# Altium footprint library mastermind.PCBLIB: 1061 footprints (part 52 of 67)
Each footprint in its own frame and in the unit in brackets; x right, y up, seen from the top. Pads: shape width x height; smd on the part's side, far side on the other; paste and mask are expansions set on the pad; w line width, h text height; cw(c..) or ccw(c..) is an arc to the next point about the centre after c.
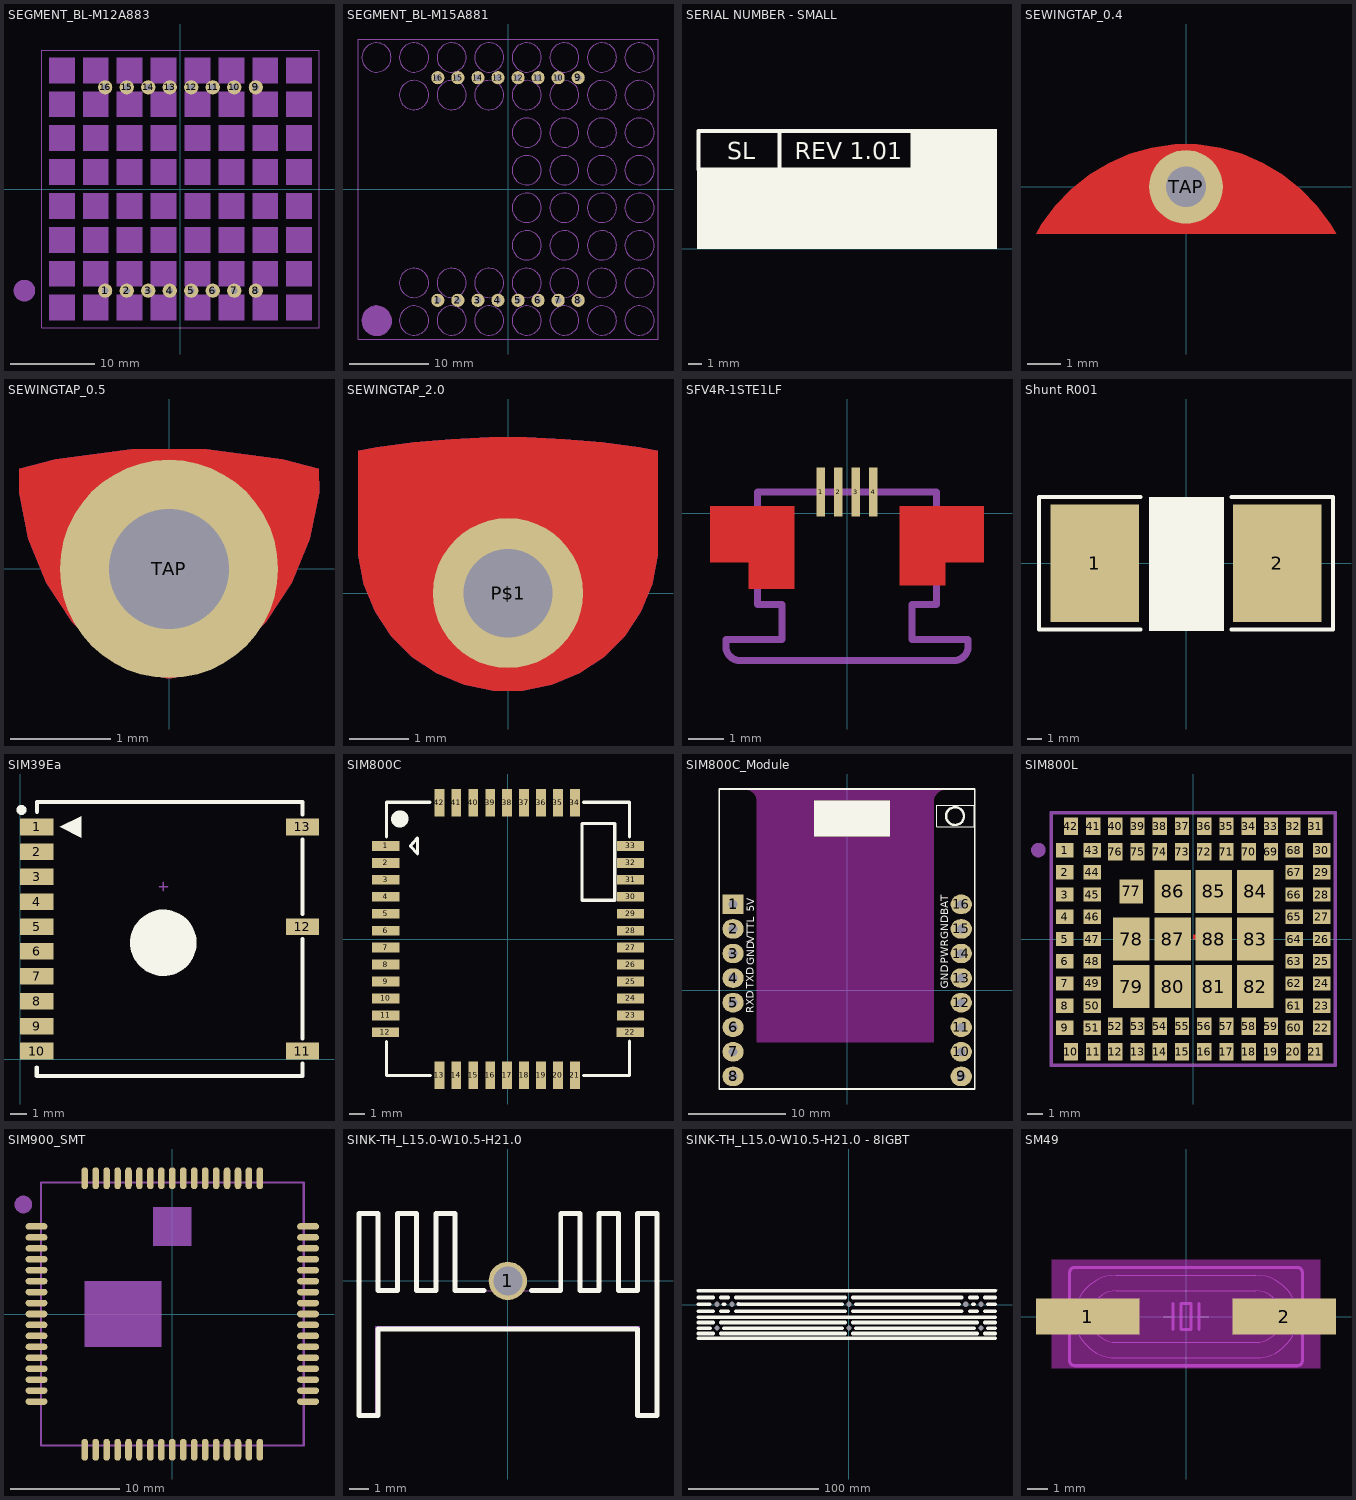
[diagram p51: the footprints below, top view; thin cyan lines are the x and y axes]

## SEGMENT_BL-M12A883 [mil]
pads (16):
  round 66 hole 31.5: 1(-350,-472.44) 2(-250,-472.44) 3(-150,-472.44) 4(-50,-472.44) 5(50,-472.44) 6(150,-472.44) 7(250,-472.44) 8(350,-472.44) 9(350,472.44) 10(250,472.44) 11(150,472.44) 12(50,472.44) 13(-50,472.44) 14(-150,472.44) 15(-250,472.44) 16(-350,472.44)
Mechanical 2:
  circle w50: c-725.59,-472.44 r25
  lines w5: -643.7,-643.7 -643.7,643.7 643.7,643.7 643.7,-643.7 -643.7,-643.7
Mechanical 8:
  drawing of 68 lines, arcs and shapes, not listed

## SEGMENT_BL-M15A881 [mil]
pads (16):
  round 66 hole 31.5: 1(-350,-555.12) 2(-250,-555.12) 3(-150,-555.12) 4(-50,-555.12) 5(50,-555.12) 6(150,-555.12) 7(250,-555.12) 8(350,-555.12) 9(350,555.12) 10(250,555.12) 11(150,555.12) 12(50,555.12) 13(-50,555.12) 14(-150,555.12) 15(-250,555.12) 16(-350,555.12)
Mechanical 2:
  circle w100: c-654.33,-658.66 r25
  lines w5: -748.03,-748.03 -748.03,748.03 748.03,748.03 748.03,-748.03 -748.03,-748.03
Mechanical 8:
  circle w5: c655.91,-655.91 r72.83
  circle w5: c655.91,-468.5 r72.83
  circle w5: c655.91,-281.1 r72.83
  circle w5: c655.91,655.91 r72.83
  circle w5: c655.91,468.5 r72.83
  circle w5: c655.91,281.1 r72.83
  circle w5: c655.91,93.7 r72.83
  circle w5: c655.91,-93.7 r72.83
  circle w5: c-655.91,-655.91 r72.83
  circle w5: c-468.5,-655.91 r72.83
  circle w5: c468.5,-655.91 r72.83
  circle w5: c281.1,-655.91 r72.83
  circle w5: c93.7,-655.91 r72.83
  circle w5: c-93.7,-655.91 r72.83
  circle w5: c-281.1,-655.91 r72.83
  circle w5: c-468.5,-468.5 r72.83
  circle w5: c468.5,-468.5 r72.83
  circle w5: c281.1,-468.5 r72.83
  circle w5: c93.7,-468.5 r72.83
  circle w5: c-93.7,-468.5 r72.83
  circle w5: c-281.1,-468.5 r72.83
  circle w5: c468.5,-281.1 r72.83
  circle w5: c281.1,-281.1 r72.83
  circle w5: c93.7,-281.1 r72.83
  circle w5: c468.5,-93.7 r72.83
  circle w5: c281.1,-93.7 r72.83
  circle w5: c93.7,-93.7 r72.83
  circle w5: c468.5,93.7 r72.83
  circle w5: c281.1,93.7 r72.83
  circle w5: c93.7,93.7 r72.83
  circle w5: c468.5,281.1 r72.83
  circle w5: c281.1,281.1 r72.83
  circle w5: c93.7,281.1 r72.83
  circle w5: c-655.91,655.91 r72.83
  circle w5: c-468.5,655.91 r72.83
  circle w5: c468.5,655.91 r72.83
  circle w5: c281.1,655.91 r72.83
  circle w5: c93.7,655.91 r72.83
  circle w5: c-93.7,655.91 r72.83
  circle w5: c-281.1,655.91 r72.83
  circle w5: c-468.5,468.5 r72.83
  circle w5: c468.5,468.5 r72.83
  circle w5: c281.1,468.5 r72.83
  circle w5: c93.7,468.5 r72.83
  circle w5: c-93.7,468.5 r72.83
  circle w5: c-281.1,468.5 r72.83
  lines w5: -748.03,-748.03 -748.03,748.03 748.03,748.03 748.03,-748.03 -748.03,-748.03

## SERIAL NUMBER - SMALL [mm]
Top Overlay:
  rectangle: 19.052,-0.01 25.402,9.007
  rectangle: 2.807,-0.01 19.19,6.117
  lines w0.3: 9.019,5.959 9.019,8.88 ; 2.923,5.959 19.052,5.959 19.052,8.88 2.923,8.88 2.923,5.959
  text "REV 1.01" at 10.162,6.721 h1.3
  text "SL" at 5.082,6.721 h1.3

## SEWINGTAP_0.4 [mil]
pads (1):
  round 86 hole 47.24: TAP(0,0)
Top Layer:
  region: -175,-55 175,-55 168.51,-43.3 152.58,-21.81 133.98,-2.58 113.04,14.06 90.1,27.83 65.56,38.48 39.84,45.84 13.37,49.77 0,50 -13.37,49.77 -39.84,45.84 -65.56,38.48 -90.1,27.83 -113.04,14.06 -133.98,-2.58 -152.58,-21.81 -168.51,-43.3
Top Solder:
  region: -175,-55 175,-55 168.51,-43.3 152.58,-21.81 133.98,-2.58 113.04,14.06 90.1,27.83 65.56,38.48 39.84,45.84 13.37,49.77 0,50 -13.37,49.77 -39.84,45.84 -65.56,38.48 -90.1,27.83 -113.04,14.06 -133.98,-2.58 -152.58,-21.81 -168.51,-43.3

## SEWINGTAP_0.5 [mil]
pads (1):
  round 86 hole 47.24: TAP(0,0)
Top Layer:
  region: 59.06,39.37 44.61,43.24 14.96,47.15 -14.96,47.15 -44.61,43.24 -59.06,39.37 -59.08,30.06 -55.48,11.78 -48.39,-5.45 -38.07,-20.96 -31.5,-27.56 -28.16,-30.52 -20.78,-35.51 -12.8,-39.5 -4.37,-42.42 0,-43.31 4.37,-42.42 12.8,-39.5 20.78,-35.51 28.16,-30.52 31.5,-27.56 38.07,-20.96 48.39,-5.45 55.48,11.78 59.08,30.06
Bottom Layer:
  region: 59.06,39.37 44.61,43.24 14.96,47.15 -14.96,47.15 -44.61,43.24 -59.06,39.37 -59.08,30.06 -55.48,11.78 -48.39,-5.45 -38.07,-20.96 -31.5,-27.56 -28.16,-30.52 -20.78,-35.51 -12.8,-39.5 -4.37,-42.42 0,-43.31 4.37,-42.42 12.8,-39.5 20.78,-35.51 28.16,-30.52 31.5,-27.56 38.07,-20.96 48.39,-5.45 55.48,11.78 59.08,30.06
Top Solder:
  region: 59.06,39.37 44.61,43.24 14.96,47.15 -14.96,47.15 -44.61,43.24 -59.06,39.37 -59.08,30.06 -55.48,11.78 -48.39,-5.45 -38.07,-20.96 -31.5,-27.56 -28.16,-30.52 -20.78,-35.51 -12.8,-39.5 -4.37,-42.42 0,-43.31 4.37,-42.42 12.8,-39.5 20.78,-35.51 28.16,-30.52 31.5,-27.56 38.07,-20.96 48.39,-5.45 55.48,11.78 59.08,30.06
Bottom Solder:
  region: 59.06,39.37 44.61,43.24 14.96,47.15 -14.96,47.15 -44.61,43.24 -59.06,39.37 -59.08,30.06 -55.48,11.78 -48.39,-5.45 -38.07,-20.96 -31.5,-27.56 -28.16,-30.52 -20.78,-35.51 -12.8,-39.5 -4.37,-42.42 0,-43.31 4.37,-42.42 12.8,-39.5 20.78,-35.51 28.16,-30.52 31.5,-27.56 38.07,-20.96 48.39,-5.45 55.48,11.78 59.08,30.06

## SEWINGTAP_2.0 [mm]
pads (1):
  round 2.54 hole 1.5: P$1(0,0)
Top Layer:
  region: 2.54,2.413 2.226,2.468 1.593,2.552 0.957,2.607 0.319,2.635 -0.319,2.635 -0.957,2.607 -1.593,2.552 -2.226,2.468 -2.54,2.413 -2.54,0.889 -2.54,0.639 -2.442,0.148 -2.251,-0.314 -1.973,-0.73 -1.619,-1.084 -1.203,-1.362 -0.741,-1.553 -0.25,-1.651 0,-1.651 0.25,-1.651 0.741,-1.553 1.203,-1.362 1.619,-1.084 1.973,-0.73 2.251,-0.314 2.442,0.148 2.54,0.639 2.54,0.889
Bottom Layer:
  region: 2.54,2.413 2.226,2.468 1.593,2.552 0.957,2.607 0.319,2.635 -0.319,2.635 -0.957,2.607 -1.593,2.552 -2.226,2.468 -2.54,2.413 -2.54,0.889 -2.54,0.639 -2.442,0.148 -2.251,-0.314 -1.973,-0.73 -1.619,-1.084 -1.203,-1.362 -0.741,-1.553 -0.25,-1.651 0,-1.651 0.25,-1.651 0.741,-1.553 1.203,-1.362 1.619,-1.084 1.973,-0.73 2.251,-0.314 2.442,0.148 2.54,0.639 2.54,0.889
Top Solder:
  region: 2.54,2.413 2.226,2.468 1.593,2.552 0.957,2.607 0.319,2.635 -0.319,2.635 -0.957,2.607 -1.593,2.552 -2.226,2.468 -2.54,2.413 -2.54,0.889 -2.54,0.639 -2.442,0.148 -2.251,-0.314 -1.973,-0.73 -1.619,-1.084 -1.203,-1.362 -0.741,-1.553 -0.25,-1.651 0,-1.651 0.25,-1.651 0.741,-1.553 1.203,-1.362 1.619,-1.084 1.973,-0.73 2.251,-0.314 2.442,0.148 2.54,0.639 2.54,0.889
Bottom Solder:
  region: 2.54,2.413 2.226,2.468 1.593,2.552 0.957,2.607 0.319,2.635 -0.319,2.635 -0.957,2.607 -1.593,2.552 -2.226,2.468 -2.54,2.413 -2.54,0.889 -2.54,0.639 -2.442,0.148 -2.251,-0.314 -1.973,-0.73 -1.619,-1.084 -1.203,-1.362 -0.741,-1.553 -0.25,-1.651 0,-1.651 0.25,-1.651 0.741,-1.553 1.203,-1.362 1.619,-1.084 1.973,-0.73 2.251,-0.314 2.442,0.148 2.54,0.639 2.54,0.889

## SFV4R-1STE1LF [mm]
pads (4):
  rect 0.25x1.4 smd mask-0.7: 1(-0.75,0.6) 2(-0.25,0.6) 3(0.25,0.6) 4(0.75,0.6)
Top Layer:
  region: -3.9,-1.4 -3.9,0.2 -1.5,0.2 -1.5,-1.4
  region: -2.8,-2.15 -2.8,-1.3 -1.5,-1.3 -1.5,-2.15
  region: 1.5,-1.4 1.5,0.2 3.9,0.2 3.9,-1.4
  region: 1.5,-2.05 1.5,-1.2 2.8,-1.2 2.8,-2.05
Top Paste:
  region: -4.275,-1.9 -4.275,0.075 -2.1,0.075 -2.1,-1.9
  region: -3.2,-2.75 -3.2,-1.9 -2.1,-1.9 -2.1,-2.75
  region: 2.1,-1.9 2.1,0.075 4.275,0.075 4.275,-1.9
  region: 2.1,-2.75 2.1,-1.9 3.2,-1.9 3.2,-2.75
Top Solder:
  region: -2.8,-2.15 -2.8,-1.3 -1.5,-1.3 -1.5,-2.15
  region: -0.9,-0.1 -0.9,1.3 -0.6,1.3 -0.6,-0.1
  region: -0.4,-0.1 -0.4,1.3 -0.1,1.3 -0.1,-0.1
  region: 0.1,-0.1 0.1,1.3 0.4,1.3 0.4,-0.1
  region: 0.6,-0.1 0.6,1.3 0.9,1.3 0.9,-0.1
  region: -3.9,-1.4 -3.9,0.2 -1.5,0.2 -1.5,-1.4
  region: 1.5,-1.4 1.5,0.2 3.9,0.2 3.9,-1.4
  region: 1.5,-2.1 1.5,-1.4 2.8,-1.4 2.8,-2.1
Mechanical 2:
  lines w0.203: -2.55,-2.6 -1.85,-2.6 -1.85,-3.6 -3.45,-3.6 -3.45,-3.8 ccw(c-3.05,-3.8) -3.05,-4.2 3.05,-4.2 ccw(c3.05,-3.8) 3.45,-3.8 3.45,-3.6 1.85,-3.6 1.85,-2.6 2.55,-2.6 ; -2.55,0.6 -1.25,0.6 ; 1.25,0.6 2.55,0.6
Mechanical 8:
  lines w0.203: -2.55,-2.6 -2.55,0.6 ; -1.25,0.6 1.25,0.6 ; 2.55,-2.6 2.55,0.6
  lines w0.5: -3.5,-1 -2.7,-1 -2.7,-0.15 -3.5,-0.15 ; 3.5,-1 2.7,-1 2.7,-0.15 3.5,-0.15

## Shunt R001 [mm]
pads (2):
  rect 6x8 smd: 1(-6.2,0) 2(6.2,0)
Top Overlay:
  rectangle: -2.5,-4.6 2.6,4.5
  lines w0.25: -3.1,-4.5 -10,-4.5 -10,4.5 -3.1,4.5 ; 3.1,-4.5 10,-4.5 10,4.5 3.1,4.5
Mechanical 30:
  region: -0.5,-1 -0.5,1 0.5,1 0.5,-1

## SIM39Ea [mm] "Lora module"
height 3.2
pads (13):
  rect 2x1 smd: 1(1,14) 2(1,12.5) 3(1,11) 4(1,9.5) 5(1,8) 6(1,6.5) 7(1,5) 8(1,3.5) 9(1,2) 10(1,0.5) 11(17,0.5) 12(17,8) 13(17,14)
Top Overlay:
  circle w2: c8.623,7.023 r1
  circle w0.3: c0.075,15.025 r0.15
  region: 2.395,14 3.665,13.365 3.665,14.635
  lines w0.254: 0.991,-0.487 0.991,-1 17.005,-1 17.005,-0.254 ; 1.016,14.916 1.016,15.5 9.185,15.5 13.196,15.5 17.005,15.5 17.005,14.754 ; 17.005,1.254 17.005,7.246 ; 17.005,8.754 17.005,13.246
  text ".Designator" at 1.054,-1.829 h1
Mechanical 15:
  lines w0.1: 8.371,10.402 8.879,10.402 ; 8.625,10.148 8.625,10.656

## SIM800C [mil]
pads (42):
  rect 70x25 smd: 1(-312.74,237.81) 2(-312.74,194.5) 3(-312.74,151.2) 4(-312.74,107.89) 5(-312.74,64.58) 6(-312.74,21.28) 7(-312.74,-22.03) 8(-312.74,-65.34) 9(-312.74,-108.65) 10(-312.74,-151.95) 11(-312.74,-195.26) 12(-313.24,-238.19) 22(312.74,-238.19) 23(313.24,-195.26) 24(313.24,-151.95) 25(313.24,-108.65) 26(313.24,-65.34) 27(313.24,-22.03) 28(313.24,21.28) 29(313.24,64.58) 30(313.24,107.89) 31(313.24,151.2) 32(313.24,194.5) 33(313.24,237.81)
  rect 25x70 smd: 13(-175.45,-348.43) 14(-132.14,-348.43) 15(-88.83,-348.43) 16(-45.53,-348.43) 17(-2.22,-348.43) 18(41.09,-348.43) 19(84.4,-348.43) 20(127.7,-348.43) 21(171.01,-348.43) 34(171.01,348.43) 35(127.7,348.43) 36(84.4,348.43) 37(41.09,348.43) 38(-2.22,348.43) 39(-45.53,348.43) 40(-88.83,348.43) 41(-132.14,348.43) 42(-175.45,348.43)
Top Overlay:
  circle w40: c-276.5,307 r2
  lines w8: -311,-261.69 -311,-348.5 -197.95,-348.5 ; -311,260.31 -311,349.5 -199.24,349.5 ; 193.76,-348.5 311,-348.5 311,-260.69 ; 193.76,349.5 311,349.5 311,260.31 ; -249.5,238 -231,217.5 -231,258.5 -249.5,238 ; 189,99 189,295 273,295 273,261 273,99 189,99
3D body "SIM800C.STEP": height 89.51, standoff -2.62, extent -309,-345.56 309.11,347.36

## SIM800C_Module [mm]
pads (16):
  rect 2.2x2 hole 0.9: 1(-11.785,8.89)
  oval 2.2x2 hole 0.9: 2(-11.785,6.35) 3(-11.785,3.81) 4(-11.785,1.27) 5(-11.785,-1.27) 6(-11.785,-3.81) 7(-11.785,-6.35) 8(-11.785,-8.89) 9(11.786,-8.89) 10(11.786,-6.35) 11(11.786,-3.81) 12(11.786,-1.27) 13(11.786,1.27) 14(11.786,3.81) 15(11.786,6.35) 16(11.786,8.89)
Top Overlay:
  circle w0.254: c11.155,18.009 r0.922
  region: 4.385,19.609 4.385,15.909 -3.415,15.909 -3.415,19.609
  lines w0.127: 9.262,16.909 13.155,16.909 13.155,19.109 9.262,19.109 9.262,19.009 9.262,16.909
  lines w0.2: -13.215,-10.191 -13.215,20.809 13.185,20.809 13.185,-10.191 -13.215,-10.191
  text "GND" at 10.433,0.167 h0.8
  text "GND" at 10.456,5.307 h0.8
  text "PWR" at 10.433,2.734 h0.8
  text "BAT" at 10.433,7.767 h0.8
  text "5V" at -9.59,8.121 h0.8
  text "VTTL" at -9.59,4.937 h0.8
  text "GND" at -9.617,2.607 h0.8
  text "TXD" at -9.627,0.167 h0.8
  text "RXD" at -9.637,-2.353 h0.8
Bottom Overlay:
  lines w0.2: -10.16,-1.471 -10.42,-1.261 ; -10.16,-1.051 -10.42,-1.261 ; -10.16,1.007 -10.42,1.217 ; -10.16,1.427 -10.42,1.217 ; -10.16,3.594 -10.42,3.804 ; -10.16,4.014 -10.42,3.804 ; -10.16,6.112 -10.42,6.322 ; -10.16,6.532 -10.42,6.322 ; -9.76,-1.261 -10.42,-1.261 ; -9.76,1.217 -10.42,1.217 ; -9.76,3.804 -10.42,3.804 ; -9.76,6.322 -10.42,6.322 ; 9.743,3.811 10.403,3.811 ; 9.743,6.312 10.403,6.312 ; 9.743,8.865 10.403,8.865 ; 10.143,3.601 10.403,3.811 ; 10.143,4.021 10.403,3.811 ; 10.143,6.102 10.403,6.312 ; 10.143,6.522 10.403,6.312 ; 10.143,8.655 10.403,8.865 ; 10.143,9.075 10.403,8.865
Keep-Out Layer:
  region: -9.244,-5.18 8.885,-5.18 8.885,19.531 8.891,19.657 8.941,19.905 9.037,20.138 9.178,20.348 9.262,20.442 9.548,20.728 9.568,20.746 9.613,20.776 9.663,20.797 9.716,20.807 9.743,20.809 -10.514,20.809 -10.397,20.803 -10.168,20.757 -9.952,20.668 -9.758,20.538 -9.671,20.459 -9.463,20.252 -9.414,20.197 -9.333,20.075 -9.276,19.94 -9.248,19.796 -9.244,19.723
  lines w0.2: -11.238,20.809 -10.514,20.809 cw(c-10.514,19.539) -9.244,19.539 ; -9.244,18.678 -9.244,19.539 ; 10.155,20.809 ccw(c10.155,19.539) 8.885,19.539 8.885,-5.28 -9.244,-5.28 -9.244,19.539

## SIM800L [mm]
pads (88):
  rect 1.1x0.9 smd: 1(-8.1,5.6) 2(-8.1,4.2) 3(-8.1,2.8) 4(-8.1,1.4) 5(-8.1,0) 6(-8.1,-1.4) 7(-8.1,-2.8) 8(-8.1,-4.2) 9(-8.1,-5.6) 22(8.1,-5.6) 23(8.1,-4.2) 24(8.1,-2.8) 25(8.1,-1.4) 26(8.1,0) 27(8.1,1.4) 28(8.1,2.8) 29(8.1,4.2) 30(8.1,5.6) 43(-6.36,5.6) 44(-6.36,4.2) 45(-6.36,2.8) 46(-6.36,1.4) 47(-6.36,0) 48(-6.36,-1.4) 49(-6.36,-2.8) 50(-6.36,-4.2) 51(-6.36,-5.6) 60(6.36,-5.6) 61(6.36,-4.2) 62(6.36,-2.8) 63(6.36,-1.4) 64(6.36,0) 65(6.36,1.4) 66(6.36,2.8) 67(6.36,4.2) 68(6.36,5.6)
  rect 0.9x1.1 smd: 10(-7.7,-7.1) 11(-6.3,-7.1) 12(-4.9,-7.1) 13(-3.5,-7.1) 14(-2.1,-7.1) 15(-0.7,-7.1) 16(0.7,-7.1) 17(2.1,-7.1) 18(3.5,-7.1) 19(4.9,-7.1) 20(6.3,-7.1) 21(7.7,-7.1) 31(7.7,7.1) 32(6.3,7.1) 33(4.9,7.1) 34(3.5,7.1) 35(2.1,7.1) 36(0.7,7.1) 37(-0.7,7.1) 38(-2.1,7.1) 39(-3.5,7.1) 40(-4.9,7.1) 41(-6.3,7.1) 42(-7.7,7.1) 52(-4.9,-5.5) 53(-3.5,-5.5) 54(-2.1,-5.5) 55(-0.7,-5.5) 56(0.7,-5.5) 57(2.1,-5.5) 58(3.5,-5.5) 59(4.9,-5.5) 69(4.9,5.5) 70(3.5,5.5) 71(2.1,5.5) 72(0.7,5.5) 73(-0.7,5.5) 74(-2.1,5.5) 75(-3.5,5.5) 76(-4.9,5.5)
  rect 1.5x1.5 smd: 77(-3.9,3)
  rect 2.3x2.7 smd: 78(-3.9,0) 79(-3.9,-3) 80(-1.3,-3) 81(1.3,-3) 82(3.9,-3) 83(3.9,0) 84(3.9,3) 85(1.3,3) 86(-1.3,3) 87(-1.3,0) 88(1.3,0)
Top Layer:
  region: 0,0 0.254,0 0.254,0.254 0,0.254
Mechanical 2:
  circle w0.61: c-9.75,5.6 r0.15
  lines w0.127: -9,-8 9,-8 9,8 -9,8 -9,-8
Mechanical 8:
  lines w0.127: -8.9,-7.9 -8.9,7.9 8.9,7.9 8.9,-7.9 -8.9,-7.9

## SIM900_SMT [mm]
pads (68):
  rrect100% 2x0.6 smd: P$1(-12.4,8) P$2(-12.4,7) P$3(-12.4,6) P$4(-12.4,5) P$5(-12.4,4) P$6(-12.4,3) P$7(-12.4,2) P$8(-12.4,1) P$9(-12.4,0) P$10(-12.4,-1) P$11(-12.4,-2) P$12(-12.4,-3) P$13(-12.4,-4) P$14(-12.4,-5) P$15(-12.4,-6) P$16(-12.4,-7) P$17(-12.4,-8) P$35(12.4,-8) P$36(12.4,-7) P$37(12.4,-6) P$38(12.4,-5) P$39(12.4,-4) P$40(12.4,-3) P$41(12.4,-2) P$42(12.4,-1) P$43(12.4,0) P$44(12.4,1) P$45(12.4,2) P$46(12.4,3) P$47(12.4,4) P$48(12.4,5) P$49(12.4,6) P$50(12.4,7) P$51(12.4,8)
  rrect100% 0.6x2 smd: P$18(-8,-12.4) P$19(-7,-12.4) P$20(-6,-12.4) P$21(-5,-12.4) P$22(-4,-12.4) P$23(-3,-12.4) P$24(-2,-12.4) P$25(-1,-12.4) P$26(0,-12.4) P$27(1,-12.4) P$28(2,-12.4) P$29(3,-12.4) P$30(4,-12.4) P$31(5,-12.4) P$32(6,-12.4) P$33(7,-12.4) P$34(8,-12.4) P$52(8,12.4) P$53(7,12.4) P$54(6,12.4) P$55(5,12.4) P$56(4,12.4) P$57(3,12.4) P$58(2,12.4) P$59(1,12.4) P$60(0,12.4) P$61(-1,12.4) P$62(-2,12.4) P$63(-3,12.4) P$64(-4,12.4) P$65(-5,12.4) P$66(-6,12.4) P$67(-7,12.4) P$68(-8,12.4)
Mechanical 2:
  circle w0.813: c-13.6,10 r0.4
  lines w0.203: -12,-9 -12,-12 -9,-12 ; -12,9 -12,12 -9,12 ; 9,-12 12,-12 12,-9 ; 9,12 12,12 12,9
Mechanical 8:
  lines w0.203: -12,-12 -12,12 12,12 12,-12 -12,-12
Mechanical 29 (Mech34):
  region: -8,-3 -8,3 -1,3 -1,-3
  region: -1.75,6.25 -1.75,9.75 1.75,9.75 1.75,6.25

## SINK-TH_L15.0-W10.5-H21.0 [mm]
pads (1):
  round 2 hole 1.5 paste-2539.97 mask+0.051: 1(0,0)
Top Overlay:
  lines w0.254: -1.233,-0.5 -2.75,-0.5 -2.75,3.5 -3.75,3.5 -3.75,-0.5 -4.75,-0.5 -4.75,3.5 -5.75,3.5 -5.75,-0.5 -6.75,-0.5 -6.75,3.5 -7.75,3.5 -7.75,-7 -6.75,-7 -6.75,-2.5 6.75,-2.5 6.75,-7 7.75,-7 7.75,3.5 6.75,3.5 6.75,-0.5 5.75,-0.5 5.75,3.5 4.75,3.5 4.75,-0.5 3.75,-0.5 3.75,3.5 2.75,3.5 2.75,-0.5 1.233,-0.5
Mechanical 6:
  region: 6.7,-7 6.7,-2.5 -6.75,-2.5 -6.75,-2.55 -6.75,-7 -6.85,-7 -6.9,-7 -6.9,-2.35 6.85,-2.35 6.85,-2.5 6.85,-7
Mechanical 15:
  region: 7.81,3.5 7.81,3.525 7.775,3.56 7.725,3.56 7.69,3.525 7.69,3.5 7.69,3.475 7.725,3.44 7.775,3.44 7.81,3.475
  region: 0.65,0 0.648,0.128 0.548,0.364 0.365,0.544 0.128,0.641 -0.128,0.641 -0.365,0.544 -0.548,0.364 -0.648,0.128 -0.65,0 -0.648,-0.128 -0.548,-0.364 -0.365,-0.544 -0.128,-0.641 0.128,-0.641 0.365,-0.544 0.548,-0.364 0.648,-0.128
  lines w0.051: -7.8,-7 -7.75,-7 -6.75,-7 -6.75,-2.5 6.7,-2.5 6.7,-7 6.75,-7 7.75,-7 7.75,3.5 6.75,3.5 6.75,-0.5 5.75,-0.5 5.75,3.5 4.75,3.5 4.75,-0.5 3.75,-0.5 3.75,3.5 2.75,3.5 2.75,3.45 2.75,-0.5 -2.75,-0.5 -2.75,3.5 -3.75,3.5 -3.75,-0.5 -4.75,-0.5 -4.75,3.45 -4.75,3.5 -5.75,3.5 -5.75,-0.5 -6.75,-0.5 -6.75,3.5 -7.8,3.5 -7.8,-7
3D body "HeatsinkTO220.step": height 20, standoff 0, extent -7.5,-7.3 7.5,3.7

## SINK-TH_L15.0-W10.5-H21.0 - 8IGBT [mm]
pads (8):
  round 0 hole 4: 1(-101.6,-18) 1(-101.6,0.295) 1(-90,0.295) 1(0,-18) 1(0,0.295) 1(90,0.295) 1(101.6,-18) 1(101.6,0.295)
Top Overlay:
  lines w0.3: -116.954,11.165 -116.795,11.324 113.988,11.324 114.028,11.364
  lines w2.8: -115.832,-25.902 112.668,-25.902 ; -115.832,-22.283 -104.6,-22.283 ; -115.832,-18.184 -106.863,-18.184 ; -115.832,-13.849 -104.6,-13.849 ; -115.832,-9.795 112.668,-9.795 ; -115.832,-5.025 -104.6,-5.025 ; -115.832,0.194 -107.083,0.194 ; -115.832,5.413 -104.6,5.413 ; -115.832,10.632 112.668,10.632 ; -98.6,-22.283 -3,-22.283 ; -98.6,-13.849 -3,-13.849 ; -98.6,-5.025 -93,-5.025 ; -98.6,5.413 -93,5.413 ; -96.556,0.194 -95.48,0.194 ; -96.337,-18.184 -5.265,-18.184 ; -87,-5.025 -3,-5.025 ; -87,5.413 -3,5.413 ; -84.952,0.396 -5.265,0.194 ; 3,-22.283 98.6,-22.283 ; 3,-13.849 98.6,-13.849 ; 3,-5.025 87,-5.025 ; 3,5.413 87,5.413 ; 5.263,-18.184 96.337,-18.184 ; 5.265,0.194 84.735,0.194 ; 93,-5.025 98.6,-5.025 ; 93,5.413 98.6,5.413 ; 95.266,0.295 96.334,0.295 ; 104.6,-22.283 112.668,-22.283 ; 104.6,-13.849 112.668,-13.849 ; 104.6,-5.025 112.668,-5.025 ; 104.6,5.413 112.668,5.413 ; 106.865,0.194 112.668,0.194 ; 107,-18.184 112.668,-18.184
3D body "Heatsink8Kw.STEP": height 59, standoff 1, extent -116.614,-26.214 113.386,11.786

## SM49 [mil]
pads (2):
  rect 200x70 smd: 1(-190,0) 2(190,0)
Top Layer keep-out:
  region: -260,-100 -260,110 260,110 260,-100
Mechanical 2:
  lines w2: -201.15,-45 ccw(c-135,0) -135,-80 135,-80 ccw(c135,0) 201.14,-45 ; -201.15,45 cw(c-135,-0.01) -135,80 135,80 cw(c135,0) 201.15,45 ; -156.8,-45 ccw(c-135,0.01) -135,-50 135,-50 ccw(c135,0.01) 156.8,-45 ; -156.8,45 cw(c-135,-0.01) -135,50 135,50 cw(c135,-0.01) 156.8,45 ; -45,0 -25,0 ; 25,0 45,0
  lines w6: -225,-45 -225,-85 ccw(c-215,-85) -215,-95 215,-95 ccw(c215,-85) 225,-85 225,-45 ; -225,45 -225,85 cw(c-215,85) -215,95 215,95 cw(c215,85) 225,85 225,45 ; -25,-25 -25,0 -25,25 ; 25,-25 25,0 25,25 ; -10,-25 10,-25 10,25 -10,25 -10,-25
Mechanical 8:
  lines w2: -201.15,-45 cw(c-135,0) -201.15,45 ; -156.8,-45 cw(c-135,0) -156.8,45 ; 156.8,-45 ccw(c135,0) 156.8,45 ; 201.15,-45 ccw(c135,0) 201.15,45
  lines w6: -225,-45 -225,45 ; -225,-15 -255,-15 -255,15 -225,15 ; 225,-45 225,-15 ; 225,45 225,15 ; 225,-15 255,-15 255,15 225,15 ; 225,-15 225,15